# Altium schematic symbol library IC_TI.SCHLIB: 1162 symbols (part 7 of 8) (continued)
## TPS54335ADDAR (continued)

## TPS54335ADRCR
designator U?
Integrated Circuit; Manufacturer_Name: Texas Instruments; Manufacturer_Part_Number: TPS54335ADRCR; Datasheet Link: http://www.ti.com/lit/gpn/tps54335a; Height: 1mm; Mouser Part Number: 595-TPS54335ADRCR; Mouser Price/Stock: https://www.mouser.com/Search/Refine.aspx?Keyword=595-TPS54335ADRCR
footprint DFN10_0.5-PAD(3X3)
pins: 1 VIN, 2 PH, 3 GND_1, 4 GND_2, 5 GND_3, 6 VSENSE, 7 COMP, 8 EN, 9 BOOT, 10 RT, 11 EP

## TPS54340DDA
designator U?
Integrated Circuit; Manufacturer_Name: Texas Instruments; Manufacturer_Part_Number: TPS54340DDA; Datasheet Link: http://uk.rs-online.com/web/p/products/8123476; Height: 1.7mm; Mouser Part Number: 595-TPS54340DDA; Mouser Price/Stock: https://www.mouser.com/Search/Refine.aspx?Keyword=595-TPS54340DDA; RS Part Number: 8123476P; RS Price/Stock: http://uk.rs-online.com/web/p/products/8123476P
footprint SOIC8_1.27-PAD
pins: 1 BOOT, 2 VIN, 3 EN, 4 RT/CLK, 5 FB, 6 COMP, 7 GND, 8 SW, 9 EP

## TPS54360DDA
designator U?
Integrated Circuit; Manufacturer_Name: Texas Instruments; Manufacturer_Part_Number: TPS54360DDA; Datasheet Link: http://www.ti.com/lit/gpn/tps54360; Height: 1.7mm; Mouser Part Number: 595-TPS54360DDA; Mouser Price/Stock: https://www.mouser.com/Search/Refine.aspx?Keyword=595-TPS54360DDA
footprint SOIC8_1.27-PAD
pins: 1 BOOT, 2 VIN, 3 EN, 4 RT/CLK, 5 FB, 6 COMP, 7 GND, 8 SW, 9 EP

## TPS54560BQDDARQ1
designator U?
Integrated Circuit; Manufacturer_Name: Texas Instruments; Manufacturer_Part_Number: TPS54560BQDDARQ1; Datasheet Link: http://www.ti.com/lit/gpn/tps54560b-q1; Height: 1.7mm; Mouser Part Number: 595-TPS54560BQDDARQ1; Mouser Price/Stock: https://www.mouser.com/Search/Refine.aspx?Keyword=595-TPS54560BQDDARQ1
footprint SOIC8_1.27-PAD
pins: 1 BOOT, 2 VIN, 3 EN, 4 RT/CLK, 5 FB, 6 COMP, 7 GND, 8 SW, 9 EP

## TPS54620RGYT
designator U?
Integrated Circuit; Manufacturer_Name: Texas Instruments; Manufacturer_Part_Number: TPS54620RGYT; Datasheet Link: http://www.ti.com/lit/gpn/tps54620; Mouser Part Number: 595-TPS54620RGYT; Mouser Price/Stock: https://www.mouser.com/Search/Refine.aspx?Keyword=595-TPS54620RGYT; RS Part Number: 9222408; RS Price/Stock: http://uk.rs-online.com/web/p/products/9222408
footprint VQFN14_0.5-PAD(3.5X3.5)
pins: 1 RT/CLK, 2 GND_1, 3 GND_2, 4 PVIN_1, 5 PVIN_2, 6 VIN, 7 VSENSE, 8 COMP, 9 SS/TR, 10 EN, 11 PH_1, 12 PH_2, 13 BOOST, 14 PWRGD, 15 EXPOSED_THERMAL_PAD

## TPS54628DDAR
designator U?
Integrated Circuit; Manufacturer_Name: Texas Instruments; Manufacturer_Part_Number: TPS54628DDAR; Datasheet Link: http://www.ti.com/general/docs/lit/getliterature.tsp?genericPartNumber=tps54628&fileType=pdf; Height: 1.7mm; Mouser Part Number: 595-TPS54628DDAR; Mouser Price/Stock: https://www.mouser.com/Search/Refine.aspx?Keyword=595-TPS54628DDAR
footprint SOIC8_1.27-PAD
pins: 1 EN (in), 2 VFB (in), 3 VREG5 (out), 4 SS (in), 5 GND (power), 6 SW (out), 7 VBST (out), 8 VIN (power), 9 PWPD (power)

## TPS55340PWP
designator U?
Integrated Circuit; Manufacturer_Name: Texas Instruments; Manufacturer_Part_Number: TPS55340PWP; Datasheet Link: http://www.ti.com/lit/ds/symlink/tps55340.pdf; Height: 1.2mm; Mouser Part Number: 595-TPS55340PWP; Mouser Price/Stock: https://www.mouser.com/Search/Refine.aspx?Keyword=595-TPS55340PWP; RS Part Number: 8123568P; RS Price/Stock: http://uk.rs-online.com/web/p/products/8123568P
footprint TSSOP14_0.65-PAD (TSOP, 14-Leads, Body 5.00x4.40mm, Pitch 0.65mm, Thermal Pad 2.31x2.46mm, IPC Low Density)
pins: 1 SW_1, 2 SW_2, 3 VIN, 4 EN, 5 SS, 6 SYNC, 7 AGND, 8 COMP, 9 FB, 10 FREQ, 11 NC, 12 PGND_1, 13 PGND_2, 14 PGND_3, 15 EP

## TPS55340RTER
designator U?
Integrated Circuit; Manufacturer_Name: Texas Instruments; Manufacturer_Part_Number: TPS55340RTER; Datasheet Link: http://www.ti.com/general/docs/lit/getliterature.tsp?genericPartNumber=TPS55340&&fileType=pdf; Height: 0.8mm; Mouser Part Number: 595-TPS55340RTER; Mouser Price/Stock: https://www.mouser.com/Search/Refine.aspx?Keyword=595-TPS55340RTER
footprint QFN16_0.5-PAD(3X3) (QFN, 16-Leads, Body 3.0x3.0mm (max), Pitch 0.50mm, IPC Low Density)
pins: 1 SW_1, 2 VIN, 3 EN, 4 SS, 5 SYNC, 6 AGND, 7 COMP, 8 FB, 9 FREQ, 10 NC_1, 11 PGND_1, 12 PGND_2, 13 PGND_3, 14 NC_2, 15 SW_2, 16 SW_3, 17 POWERPAD

## TPS60400DBVT
designator U?
Integrated Circuit; Manufacturer_Name: Texas Instruments; Manufacturer_Part_Number: TPS60400DBVT; Datasheet Link: http://componentsearchengine.com/Datasheets/3/TPS60400DBVT.pdf; Mouser Part Number: 595-TPS60400DBVT; Mouser Price/Stock: https://www.mouser.com/Search/Refine.aspx?Keyword=595-TPS60400DBVT; RS Part Number: 0526975; RS Price/Stock: http://uk.rs-online.com/web/p/products/0526975
footprint SOT23-5 (SOT23, 5-Leads, Body 3.0x3.0mm (max), Pitch 0.95mm, IPC Medium Density)
pins: 1 OUT, 2 IN, 3 CFLY-, 4 GND, 5 CFLY+

## TPS60401DBVT
designator U?
Integrated Circuit; Manufacturer_Name: Texas Instruments; Manufacturer_Part_Number: TPS60401DBVT; Datasheet Link: http://www.ti.com/lit/ds/symlink/tps60401.pdf; Height: 1.45mm; Mouser Part Number: 595-TPS60401DBVT; Mouser Price/Stock: https://www.mouser.com/Search/Refine.aspx?Keyword=595-TPS60401DBVT; RS Part Number: 1456522; RS Price/Stock: http://uk.rs-online.com/web/p/products/1456522
footprint SOT23-5 (SOT23, 5-Leads, Body 3.0x3.0mm (max), Pitch 0.95mm, IPC Medium Density)
pins: 1 OUT (out), 2 IN (in), 3 CFLY-, 4 GND (power), 5 CFLY+

## TPS60403QDBVRQ1
designator U?
Integrated Circuit; Manufacturer_Name: Texas Instruments; Manufacturer_Part_Number: TPS60403QDBVRQ1; Datasheet Link: http://www.ti.com/lit/gpn/tps60403-q1; Height: 1.45mm; Mouser Part Number: 595-TPS60403QDBVRQ1; Mouser Price/Stock: https://www.mouser.com/Search/Refine.aspx?Keyword=595-TPS60403QDBVRQ1
footprint SOT23-5 (SOT23, 5-Leads, Body 3.0x3.0mm (max), Pitch 0.95mm, IPC Medium Density)
pins: 1 OUT, 2 IN, 3 CFLY-, 4 GND, 5 CFLY+

## TPS61021ADSGR
designator PS??
Power Supply; Manufacturer_Name: Texas Instruments; Manufacturer_Part_Number: TPS61021ADSGR; Datasheet Link: http://www.ti.com/lit/ds/symlink/tps61021a.pdf; Height: 0.8mm; Mouser Part Number: 595-TPS61021ADSGR; Mouser Price/Stock: https://www.mouser.com/Search/Refine.aspx?Keyword=595-TPS61021ADSGR
footprint DFN8_0.5-PAD(2X2) (DFN8_0.5-PAD(3X3))
pins: 1 AGND (power), 2 FB (in), 3 VOUT_1 (power), 4 VOUT_2 (power), 5 EN (in), 6 SW_1 (power), 7 SW_2 (power), 8 VIN (in), 9 PGND (power)

## TPS61040DBVR
designator U?
Integrated Circuit; Manufacturer_Name: Texas Instruments; Manufacturer_Part_Number: TPS61040DBVR; Datasheet Link: http://www.ti.com/lit/ds/symlink/tps61040.pdf; Height: 1.45mm; Mouser Part Number: 595-TPS61040DBVR; Mouser Price/Stock: https://www.mouser.com/Search/Refine.aspx?Keyword=595-TPS61040DBVR; RS Part Number: 7320695P; RS Price/Stock: http://uk.rs-online.com/web/p/products/7320695P
footprint SOT23-5 (SOT23, 5-Leads, Body 3.0x3.0mm (max), Pitch 0.95mm, IPC Medium Density)
pins: 1 SW, 2 GND, 3 FB (power), 4 EN, 5 VIN (in)

## TPS61041DBVR
designator U?
Integrated Circuit; Manufacturer_Name: Texas Instruments; Manufacturer_Part_Number: TPS61041DBVR; Datasheet Link: http://www.ti.com/lit/gpn/tps61041; Mouser Part Number: 595-TPS61041DBVR; Mouser Price/Stock: https://www.mouser.com/Search/Refine.aspx?Keyword=595-TPS61041DBVR; RS Part Number: 7094617P; RS Price/Stock: http://uk.rs-online.com/web/p/products/7094617P
footprint SOT23-5 (SOT23, 5-Leads, Body 3.0x3.0mm (max), Pitch 0.95mm, IPC Medium Density)
pins: 1 SW, 2 GND, 3 FB, 4 EN, 5 VIN

## TPS61042DRBRG4
designator U?
Integrated Circuit; Manufacturer_Name: Texas Instruments; Manufacturer_Part_Number: TPS61042DRBRG4; Datasheet Link: http://www.ti.com/lit/ds/symlink/tps61042.pdf; Height: 1mm; Mouser Part Number: 595-TPS61042DRBRG4; Mouser Price/Stock: https://www.mouser.com/Search/Refine.aspx?Keyword=595-TPS61042DRBRG4
footprint HVSON8_0.65-PAD
pins: 1 LED, 2 RS, 3 VIN, 4 FB, 5 CTRL, 6 GND, 7 OVP, 8 SW, 9 EP

## TPS61085DGKT
designator U?
Integrated Circuit; Manufacturer_Name: Texas Instruments; Manufacturer_Part_Number: TPS61085DGKT; Datasheet Link: http://www.ti.com/lit/gpn/tps61085; Height: 1.1mm; Mouser Part Number: 595-TPS61085DGKT; Mouser Price/Stock: https://www.mouser.com/Search/Refine.aspx?Keyword=595-TPS61085DGKT; RS Part Number: 7098877P; RS Price/Stock: http://uk.rs-online.com/web/p/products/7098877P
footprint VSSOP8_0.65-PAD
pins: 1 COMP, 2 FB, 3 EN, 4 PGND, 5 SW, 6 IN, 7 FREQ, 8 SS

## TPS61085PWR
designator U?
Integrated Circuit; Manufacturer_Name: Texas Instruments; Manufacturer_Part_Number: TPS61085PWR; Datasheet Link: http://www.ti.com/lit/ds/symlink/tps61085.pdf; Height: 1.2mm; Mouser Part Number: 595-TPS61085PWR; Mouser Price/Stock: https://www.mouser.com/Search/Refine.aspx?Keyword=595-TPS61085PWR
footprint TSSOP8_0.65
pins: 1 COMP, 2 FB, 3 EN, 4 PGND (power), 5 SW, 6 IN (in), 7 FREQ, 8 SS

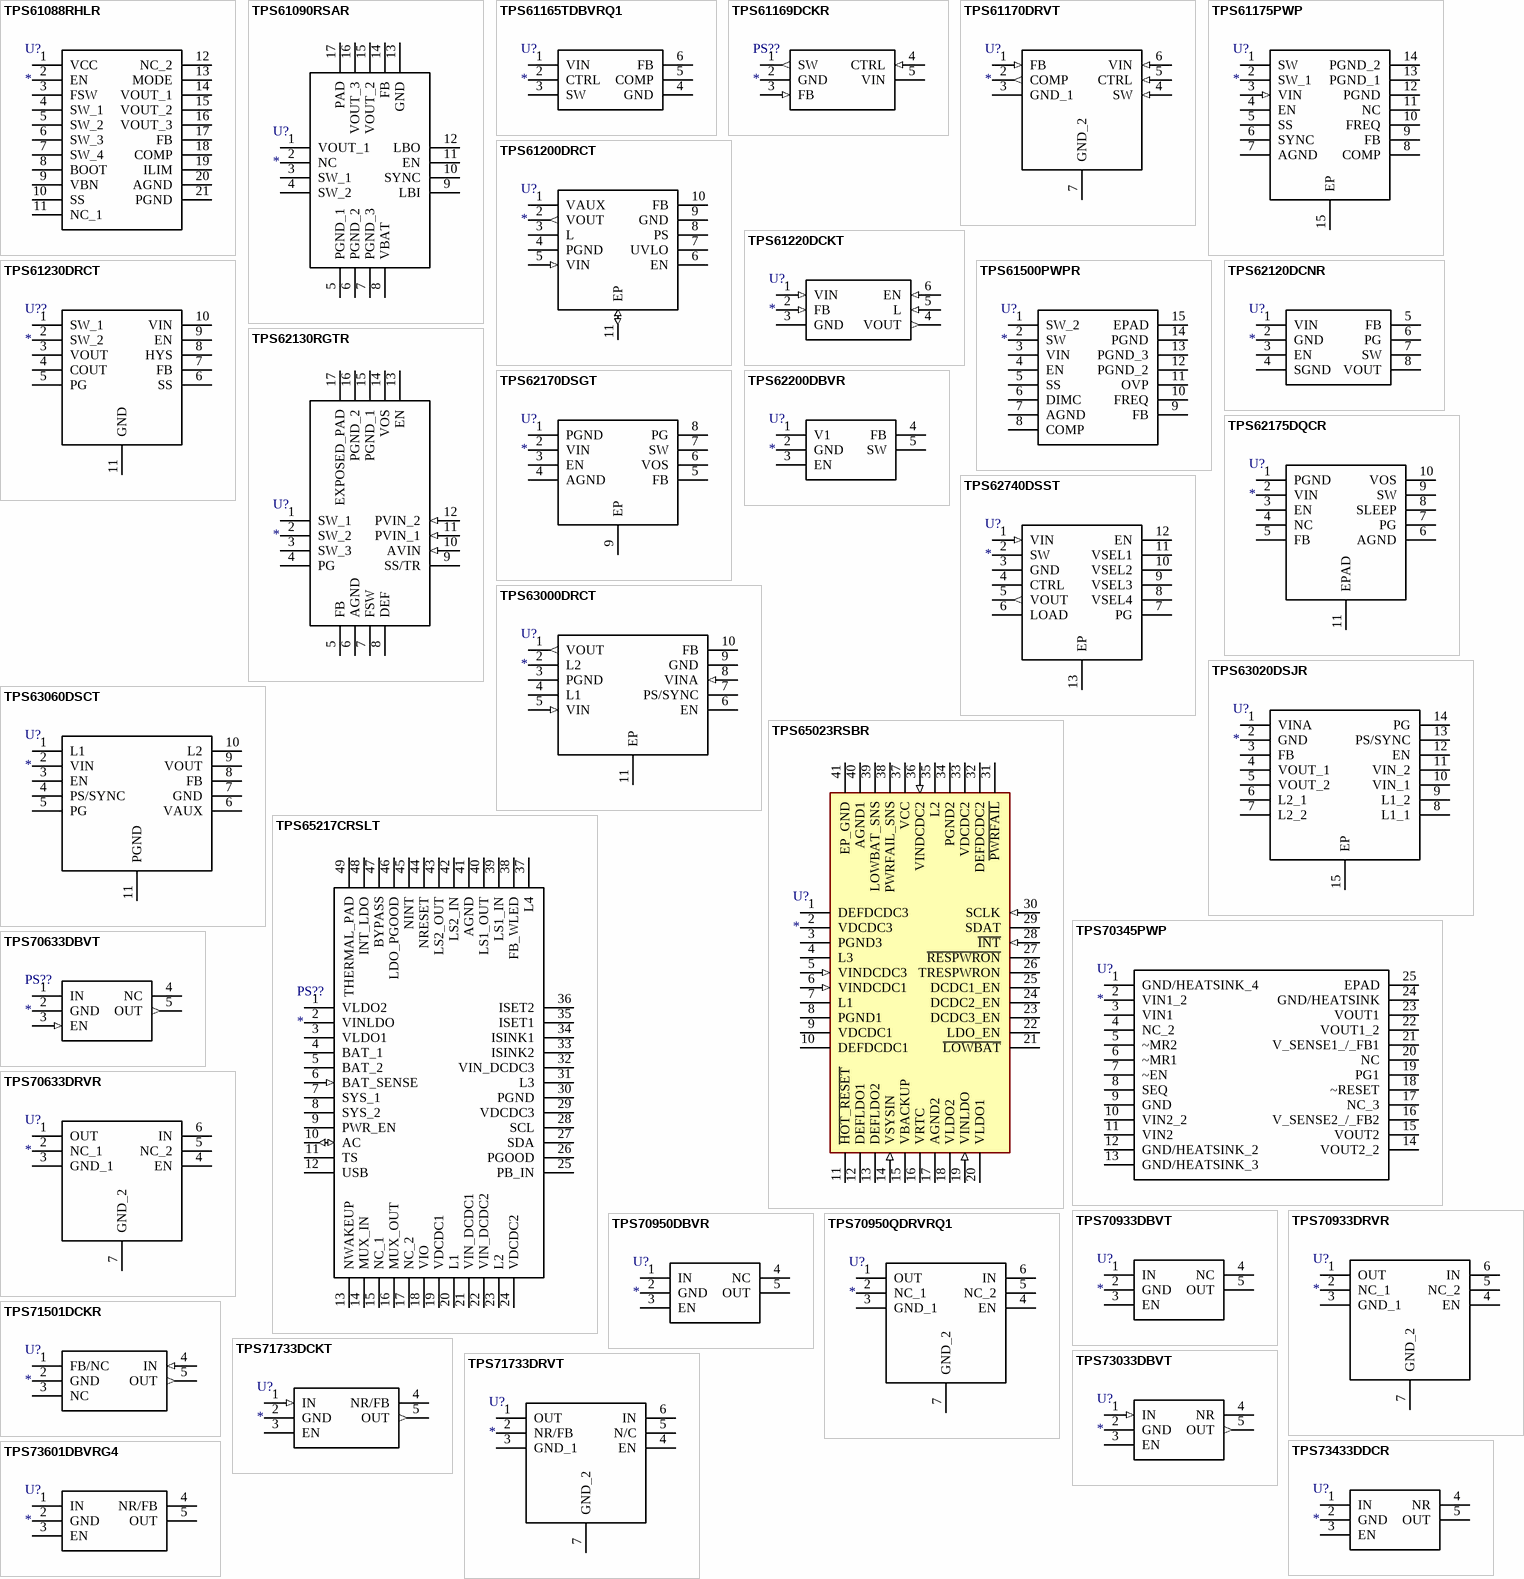
[diagram p32: symbols TPS61088RHLR to TPS73601DBVRG4]

## TPS61088RHLR
designator U?
Integrated Circuit; Manufacturer_Name: Texas Instruments; Manufacturer_Part_Number: TPS61088RHLR; Datasheet Link: http://www.ti.com/lit/gpn/tps61088; Mouser Part Number: 595-TPS61088RHLR; Mouser Price/Stock: https://www.mouser.com/Search/Refine.aspx?Keyword=595-TPS61088RHLR
footprint VQFN20_0.5-PAD(3.5X4.5) (QFN, 20-Leads, Body 4.7x3.7mm (max), Pitch 1.50mm, Pitch1 0.50mm, IPC Low Density)
pins: 1 VCC, 2 EN, 3 FSW, 4 SW_1, 5 SW_2, 6 SW_3, 7 SW_4, 8 BOOT, 9 VBN, 10 SS, 11 NC_1, 12 NC_2, 13 MODE, 14 VOUT_1, 15 VOUT_2, 16 VOUT_3, 17 FB, 18 COMP, 19 ILIM, 20 AGND, 21 PGND

## TPS61090RSAR
designator U?
Integrated Circuit; Manufacturer_Name: Texas Instruments; Manufacturer_Part_Number: TPS61090RSAR; Datasheet Link: http://www.ti.com/general/docs/lit/getliterature.tsp?genericPartNumber=tps61090&fileType=pdf; Height: 1mm; Mouser Part Number: 595-TPS61090RSAR; Mouser Price/Stock: https://www.mouser.com/Search/Refine.aspx?Keyword=595-TPS61090RSAR; RS Part Number: 1626463; RS Price/Stock: http://uk.rs-online.com/web/p/products/1626463
footprint QFN16_0.65-PAD(4x4) (QFN, 16-Leads, Body 3.0x3.0mm (max), Pitch 0.50mm, IPC Low Density)
pins: 1 VOUT_1, 2 NC, 3 SW_1, 4 SW_2, 5 PGND_1, 6 PGND_2, 7 PGND_3, 8 VBAT, 9 LBI, 10 SYNC, 11 EN, 12 LBO, 13 GND, 14 FB, 15 VOUT_2, 16 VOUT_3, 17 PAD

## TPS61165TDBVRQ1
designator U?
Integrated Circuit; Manufacturer_Name: Texas Instruments; Manufacturer_Part_Number: TPS61165TDBVRQ1; Datasheet Link: http://www.ti.com/lit/gpn/tps61165-q1; Height: 1.45mm; Mouser Part Number: 595-TPS61165TDBVRQ1; Mouser Price/Stock: https://www.mouser.com/Search/Refine.aspx?Keyword=595-TPS61165TDBVRQ1
footprint SOT23-6
pins: 1 VIN, 2 CTRL, 3 SW, 4 GND, 5 COMP, 6 FB

## TPS61169DCKR
designator PS??
Power Supply; Manufacturer_Name: Texas Instruments; Manufacturer_Part_Number: TPS61169DCKR; Datasheet Link: http://www.ti.com/lit/gpn/tps61169; Height: 1.1mm; Mouser Part Number: 595-TPS61169DCKR; Mouser Price/Stock: https://www.mouser.com/Search/Refine.aspx?Keyword=595-TPS61169DCKR
footprint SOT353
pins: 1 SW (out), 2 GND (power), 3 FB (in), 4 CTRL (in), 5 VIN (power)

## TPS61170DRVT
designator U?
Integrated Circuit; Manufacturer_Name: Texas Instruments; Manufacturer_Part_Number: TPS61170DRVT; Datasheet Link: http://www.ti.com/lit/ds/slvs789d/slvs789d.pdf; Height: 0.8mm; Mouser Part Number: 595-TPS61170DRVT; Mouser Price/Stock: https://www.mouser.com/Search/Refine.aspx?Keyword=595-TPS61170DRVT; RS Part Number: 6616948P; RS Price/Stock: http://uk.rs-online.com/web/p/products/6616948P
footprint DFN6_0.65-PAD(2.2X2.5)
pins: 1 FB (in), 2 COMP (out), 3 GND_1 (power), 4 SW (in), 5 CTRL (in), 6 VIN (in), 7 GND_2 (power)

## TPS61175PWP
designator U?
Integrated Circuit; Manufacturer_Name: Texas Instruments; Manufacturer_Part_Number: TPS61175PWP; Datasheet Link: http://docs-emea.rs-online.com/webdocs/0e32/0900766b80e32258.pdf; Height: 1.2mm; Mouser Part Number: 595-TPS61175PWP; Mouser Price/Stock: https://www.mouser.com/Search/Refine.aspx?Keyword=595-TPS61175PWP; RS Part Number: 7092435P; RS Price/Stock: http://uk.rs-online.com/web/p/products/7092435P
footprint TSSOP14_0.65-PAD (TSOP, 14-Leads, Body 5.00x4.40mm, Pitch 0.65mm, Thermal Pad 2.31x2.46mm, IPC Low Density)
pins: 1 SW, 2 SW_1, 3 VIN (in), 4 EN, 5 SS, 6 SYNC, 7 AGND (power), 8 COMP, 9 FB, 10 FREQ, 11 NC, 12 PGND (power), 13 PGND_1 (power), 14 PGND_2 (power), 15 EP

## TPS61200DRCT
designator U?
Integrated Circuit; Manufacturer_Name: Texas Instruments; Manufacturer_Part_Number: TPS61200DRCT; Datasheet Link: http://www.ti.com/lit/ds/symlink/tps61200.pdf; Height: 1mm; Mouser Part Number: 595-TPS61200DRCT; Mouser Price/Stock: https://www.mouser.com/Search/Refine.aspx?Keyword=595-TPS61200DRCT; RS Part Number: 0389322; RS Price/Stock: http://uk.rs-online.com/web/p/products/0389322
footprint DFN10_0.5-PAD(3X3)
pins: 1 VAUX, 2 VOUT (out), 3 L, 4 PGND (power), 5 VIN (in), 6 EN, 7 UVLO, 8 PS, 9 GND (power), 10 FB, 11 EP (io)

## TPS61220DCKT
designator U?
Integrated Circuit; Manufacturer_Name: Texas Instruments; Manufacturer_Part_Number: TPS61220DCKT; Datasheet Link: http://www.ti.com/lit/ds/symlink/tps61220.pdf; Height: 1.1mm; Mouser Part Number: 595-TPS61220DCKT; Mouser Price/Stock: https://www.mouser.com/Search/Refine.aspx?Keyword=595-TPS61220DCKT; RS Part Number: 7094642P; RS Price/Stock: http://uk.rs-online.com/web/p/products/7094642P
footprint SOT363
pins: 1 VIN (in), 2 FB (in), 3 GND (power), 4 VOUT (out), 5 L (in), 6 EN (in)

## TPS61230DRCT
designator U??
Undefined or Miscellaneous; Manufacturer_Name: Texas Instruments; Manufacturer_Part_Number: TPS61230DRCT; Datasheet Link: http://www.ti.com/lit/ds/symlink/tps61230.pdf; Height: 1mm; Mouser Part Number: 595-TPS61230DRCT; Mouser Price/Stock: https://www.mouser.com/Search/Refine.aspx?Keyword=595-TPS61230DRCT
footprint DFN10_0.5-PAD(3X3)
pins: 1 SW_1, 2 SW_2, 3 VOUT, 4 COUT, 5 PG, 6 SS, 7 FB, 8 HYS, 9 EN, 10 VIN, 11 GND

## TPS61500PWPR
designator U?
Integrated Circuit; Manufacturer_Name: Texas Instruments; Manufacturer_Part_Number: TPS61500PWPR; Datasheet Link: http://www.ti.com/lit/gpn/tps61500; Mouser Part Number: 595-TPS61500PWPR; Mouser Price/Stock: https://www.mouser.com/Search/Refine.aspx?Keyword=595-TPS61500PWPR
footprint TSSOP14_0.65-PAD (TSOP, 14-Leads, Body 5.00x4.40mm, Pitch 0.65mm, Thermal Pad 2.31x2.46mm, IPC Low Density)
pins: 1 SW_2, 2 SW, 3 VIN, 4 EN, 5 SS, 6 DIMC, 7 AGND, 8 COMP, 9 FB, 10 FREQ, 11 OVP, 12 PGND_2, 13 PGND_3, 14 PGND, 15 EPAD

## TPS62120DCNR
designator U?
Integrated Circuit; Manufacturer_Name: Texas Instruments; Manufacturer_Part_Number: TPS62120DCNR; Datasheet Link: http://www.ti.com/lit/gpn/tps62120; Mouser Part Number: 595-TPS62120DCNR; Mouser Price/Stock: https://www.mouser.com/Search/Refine.aspx?Keyword=595-TPS62120DCNR
footprint SOT23-8 (TSOP, 8-Leads, Body 2.9x1.6mm (max), Pitch 0.65mm, IPC Medium Density)
pins: 1 VIN, 2 GND, 3 EN, 4 SGND, 5 FB, 6 PG, 7 SW, 8 VOUT

## TPS62130RGTR
designator U?
Integrated Circuit; Manufacturer_Name: Texas Instruments; Manufacturer_Part_Number: TPS62130RGTR; Datasheet Link: http://www.ti.com/lit/ds/symlink/tps62130.pdf; Height: 0.8mm; Mouser Part Number: 595-TPS62130RGTR; Mouser Price/Stock: https://www.mouser.com/Search/Refine.aspx?Keyword=595-TPS62130RGTR
footprint QFN16_0.5-PAD(3X3) (QFN, 16-Leads, Body 3.0x3.0mm (max), Pitch 0.50mm, IPC Low Density)
pins: 1 SW_1, 2 SW_2, 3 SW_3, 4 PG, 5 FB, 6 AGND (power), 7 FSW, 8 DEF, 9 SS/TR, 10 AVIN (in), 11 PVIN_1 (in), 12 PVIN_2 (in), 13 EN, 14 VOS, 15 PGND_1 (power), 16 PGND_2 (power), 17 EXPOSED_PAD

## TPS62170DSGT
designator U?
Integrated Circuit; Manufacturer_Name: Texas Instruments; Manufacturer_Part_Number: TPS62170DSGT; Datasheet Link: http://www.ti.com/lit/gpn/tps62170; Height: 0.8mm; Mouser Part Number: 595-TPS62170DSGT; Mouser Price/Stock: https://www.mouser.com/Search/Refine.aspx?Keyword=595-TPS62170DSGT; RS Part Number: 1626775; RS Price/Stock: http://uk.rs-online.com/web/p/products/1626775
footprint DFN8_0.5-PAD(2X2) (DFN8_0.5-PAD(3X3))
pins: 1 PGND, 2 VIN, 3 EN, 4 AGND, 5 FB, 6 VOS, 7 SW, 8 PG, 9 EP

## TPS62175DQCR
designator U?
Integrated Circuit; Manufacturer_Name: Texas Instruments; Manufacturer_Part_Number: TPS62175DQCR; Datasheet Link: http://www.ti.com/lit/gpn/tps62175; Height: 0.8mm; Mouser Part Number: 595-TPS62175DQCR; Mouser Price/Stock: https://www.mouser.com/Search/Refine.aspx?Keyword=595-TPS62175DQCR; RS Part Number: 1684374; RS Price/Stock: http://uk.rs-online.com/web/p/products/1684374
footprint DFN10_0.5-PAD(2X3)
pins: 1 PGND, 2 VIN, 3 EN, 4 NC, 5 FB, 6 AGND, 7 PG, 8 SLEEP, 9 SW, 10 VOS, 11 EPAD

## TPS62200DBVR
designator U?
Integrated Circuit; Manufacturer_Name: Texas Instruments; Manufacturer_Part_Number: TPS62200DBVR; Datasheet Link: http://www.ti.com/lit/gpn/tps62200; Mouser Part Number: 595-TPS62200DBVR; Mouser Price/Stock: https://www.mouser.com/Search/Refine.aspx?Keyword=595-TPS62200DBVR
footprint SOT23-5 (SOT23, 5-Leads, Body 3.0x3.0mm (max), Pitch 0.95mm, IPC Medium Density)
pins: 1 V1, 2 GND, 3 EN, 4 FB, 5 SW

## TPS62740DSST
designator U?
Integrated Circuit; Manufacturer_Name: Texas Instruments; Manufacturer_Part_Number: TPS62740DSST; Datasheet Link: http://docs-emea.rs-online.com/webdocs/1323/0900766b81323414.pdf; Height: 0.8mm; Mouser Part Number: 595-TPS62740DSST; Mouser Price/Stock: https://www.mouser.com/Search/Refine.aspx?Keyword=595-TPS62740DSST; RS Part Number: 8257018P; RS Price/Stock: http://uk.rs-online.com/web/p/products/8257018P
footprint DFN12_0.5-PAD(3X2)
pins: 1 VIN (in), 2 SW, 3 GND (power), 4 CTRL, 5 VOUT (out), 6 LOAD, 7 PG, 8 VSEL4, 9 VSEL3, 10 VSEL2, 11 VSEL1, 12 EN, 13 EP

## TPS63000DRCT
designator U?
Integrated Circuit; Manufacturer_Name: Texas Instruments; Manufacturer_Part_Number: TPS63000DRCT; Datasheet Link: http://www.ti.com/lit/ds/symlink/tps63000.pdf; Height: 1mm; Mouser Part Number: 595-TPS63000DRCT; Mouser Price/Stock: https://www.mouser.com/Search/Refine.aspx?Keyword=595-TPS63000DRCT; RS Part Number: 0389334P; RS Price/Stock: http://uk.rs-online.com/web/p/products/0389334P
footprint DFN10_0.5-PAD(3X3)
pins: 1 VOUT (out), 2 L2, 3 PGND (power), 4 L1, 5 VIN (in), 6 EN, 7 PS/SYNC, 8 VINA (in), 9 GND (power), 10 FB, 11 EP

## TPS63020DSJR
designator U?
Integrated Circuit; Manufacturer_Name: Texas Instruments; Manufacturer_Part_Number: TPS63020DSJR; Datasheet Link: http://www.ti.com/lit/ds/symlink/tps63020.pdf; Height: 1mm; Mouser Part Number: 595-TPS63020DSJR; Mouser Price/Stock: https://www.mouser.com/Search/Refine.aspx?Keyword=595-TPS63020DSJR
footprint DFN14_0.5-PAD(3X4)
pins: 1 VINA, 2 GND, 3 FB, 4 VOUT_1, 5 VOUT_2, 6 L2_1, 7 L2_2, 8 L1_1, 9 L1_2, 10 VIN_1, 11 VIN_2, 12 EN, 13 PS/SYNC, 14 PG, 15 EP

## TPS63060DSCT
designator U?
Integrated Circuit; Manufacturer_Name: Texas Instruments; Manufacturer_Part_Number: TPS63060DSCT; Datasheet Link: http://www.ti.com/lit/ds/symlink/tps63060.pdf; Height: 0.8mm; Mouser Part Number: 595-TPS63060DSCT; Mouser Price/Stock: https://www.mouser.com/Search/Refine.aspx?Keyword=595-TPS63060DSCT; RS Part Number: 8123801P; RS Price/Stock: http://uk.rs-online.com/web/p/products/8123801P
footprint DFN10_0.5-PAD(3X3)
pins: 1 L1, 2 VIN, 3 EN, 4 PS/SYNC, 5 PG, 6 VAUX, 7 GND, 8 FB, 9 VOUT, 10 L2, 11 PGND

## TPS65023RSBR
designator U?
Integrated Circuit; Manufacturer_Name: Texas Instruments; Manufacturer_Part_Number: TPS65023RSBR; Datasheet Link: http://www.ti.com/lit/ds/symlink/tps65023.pdf; Height: 0.8mm; Mouser Part Number: 595-TPS65023RSBR; Mouser Price/Stock: https://www.mouser.com/Search/Refine.aspx?Keyword=595-TPS65023RSBR
footprint QFN40_0.4-PAD(5X5)
pins: 1 DEFDCDC3, 2 VDCDC3, 3 PGND3 (power), 4 L3, 5 VINDCDC3 (in), 6 VINDCDC1 (in), 7 L1, 8 PGND1 (power), 9 VDCDC1, 10 DEFDCDC1, 11 ~{HOT_RESET}, 12 DEFLDO1, 13 DEFLDO2, 14 VSYSIN (in), 15 VBACKUP, 16 VRTC, 17 AGND2 (power), 18 VLDO2, 19 VINLDO (in), 20 VLDO1, 21 ~{LOWBAT}, 22 LDO_EN, 23 DCDC3_EN, 24 DCDC2_EN, 25 DCDC1_EN, 26 TRESPWRON, 27 ~{RESPWRON}, 28 ~{INT} (in), 29 SDAT, 30 SCLK (in), 31 ~{PWRFAIL}, 32 DEFDCDC2, 33 VDCDC2, 34 PGND2 (power), 35 L2, 36 VINDCDC2 (in), 37 VCC (power), 38 PWRFAIL_SNS, 39 LOWBAT_SNS, 40 AGND1 (power), 41 EP_GND (power)

## TPS65217CRSLT
designator PS??
Power Supply; Manufacturer_Name: Texas Instruments; Manufacturer_Part_Number: TPS65217CRSLT; Datasheet Link: http://www.ti.com/lit/gpn/tps65217; Height: 1mm; Mouser Part Number: 595-TPS65217CRSLT; Mouser Price/Stock: https://www.mouser.com/Search/Refine.aspx?Keyword=595-TPS65217CRSLT; RS Part Number: 9222335; RS Price/Stock: http://uk.rs-online.com/web/p/products/9222335
footprint QFN48_0.4-PAD(6X6) (QFN, 48-Leads, Body 7.2x7.2mm (max), Pitch 0.50mm, IPC Medium Density)
pins: 1 VLDO2, 2 VINLDO, 3 VLDO1, 4 BAT_1 (power), 5 BAT_2 (power), 6 BAT_SENSE (in), 7 SYS_1, 8 SYS_2, 9 PWR_EN, 10 AC (io), 11 TS, 12 USB, 13 NWAKEUP, 14 MUX_IN, 15 NC_1, 16 MUX_OUT, 17 NC_2, 18 VIO, 19 VDCDC1, 20 L1, 21 VIN_DCDC1, 22 VIN_DCDC2, 23 L2, 24 VDCDC2, 25 PB_IN, 26 PGOOD, 27 SDA, 28 SCL, 29 VDCDC3, 30 PGND, 31 L3, 32 VIN_DCDC3, 33 ISINK2, 34 ISINK1, 35 ISET1, 36 ISET2, 37 L4, 38 FB_WLED, 39 LS1_IN, 40 LS1_OUT, 41 AGND, 42 LS2_IN, 43 LS2_OUT, 44 NRESET, 45 NINT, 46 LDO_PGOOD, 47 BYPASS, 48 INT_LDO, 49 THERMAL_PAD

## TPS70345PWP
designator U?
Integrated Circuit; Manufacturer_Name: Texas Instruments; Manufacturer_Part_Number: TPS70345PWP; Datasheet Link: http://www.ti.com/lit/gpn/tps703; Mouser Part Number: 595-TPS70345PWP; Mouser Price/Stock: https://www.mouser.com/Search/Refine.aspx?Keyword=595-TPS70345PWP
footprint TSSOP24_0.65-PAD (TSOP, 24-Leads, Body 7.80x4.40mm, Pitch 0.65mm, Thermal Pad 5.16x2.40mm, IPC Low Density)
pins: 1 GND/HEATSINK_4, 2 VIN1_2, 3 VIN1, 4 NC_2, 5 ~MR2, 6 ~MR1, 7 ~EN, 8 SEQ, 9 GND, 10 VIN2_2, 11 VIN2, 12 GND/HEATSINK_2, 13 GND/HEATSINK_3, 14 VOUT2_2, 15 VOUT2, 16 V_SENSE2_/_FB2, 17 NC_3, 18 ~RESET, 19 PG1, 20 NC, 21 V_SENSE1_/_FB1, 22 VOUT1_2, 23 VOUT1, 24 GND/HEATSINK, 25 EPAD

## TPS70633DBVT
designator PS??
Power Supply; Manufacturer_Name: Texas Instruments; Manufacturer_Part_Number: TPS70633DBVT; Datasheet Link: http://www.ti.com/lit/ds/symlink/tps706.pdf; Height: 1.45mm; Mouser Part Number: 595-TPS70633DBVT; Mouser Price/Stock: https://www.mouser.com/Search/Refine.aspx?Keyword=595-TPS70633DBVT
footprint SOT23-5 (SOT23, 5-Leads, Body 3.0x3.0mm (max), Pitch 0.95mm, IPC Medium Density)
pins: 1 IN (power), 2 GND (power), 3 EN (in), 4 NC, 5 OUT (out)

## TPS70633DRVR
designator U?
Integrated Circuit; Manufacturer_Name: Texas Instruments; Manufacturer_Part_Number: TPS70633DRVR; Datasheet Link: http://www.ti.com/lit/gpn/tps706; Height: 0.8mm; Mouser Part Number: 595-TPS70633DRVR; Mouser Price/Stock: https://www.mouser.com/Search/Refine.aspx?Keyword=595-TPS70633DRVR
footprint DFN6_0.65-PAD(2.2X2.5)
pins: 1 OUT, 2 NC_1, 3 GND_1, 4 EN, 5 NC_2, 6 IN, 7 GND_2

## TPS70933DBVT
designator U?
Integrated Circuit; Manufacturer_Name: Texas Instruments; Manufacturer_Part_Number: TPS70933DBVT; Datasheet Link: http://www.ti.com/lit/gpn/tps709; Height: 1.45mm; Mouser Part Number: 595-TPS70933DBVT; Mouser Price/Stock: https://www.mouser.com/Search/Refine.aspx?Keyword=595-TPS70933DBVT; RS Part Number: 8257033P; RS Price/Stock: http://uk.rs-online.com/web/p/products/8257033P
footprint SOT23-5 (SOT23, 5-Leads, Body 3.0x3.0mm (max), Pitch 0.95mm, IPC Medium Density)
pins: 1 IN, 2 GND, 3 EN, 4 NC, 5 OUT

## TPS70933DRVR
designator U?
Integrated Circuit; Manufacturer_Name: Texas Instruments; Manufacturer_Part_Number: TPS70933DRVR; Datasheet Link: http://www.ti.com/lit/gpn/tps709; Height: 0.8mm; Mouser Part Number: 595-TPS70933DRVR; Mouser Price/Stock: https://www.mouser.com/Search/Refine.aspx?Keyword=595-TPS70933DRVR
footprint DFN6_0.65-PAD(2.2X2.5)
pins: 1 OUT, 2 NC_1, 3 GND_1, 4 EN, 5 NC_2, 6 IN, 7 GND_2

## TPS70950DBVR
designator U?
Integrated Circuit; Manufacturer_Name: Texas Instruments; Manufacturer_Part_Number: TPS70950DBVR; Datasheet Link: http://www.ti.com/lit/gpn/tps709; Height: 1.45mm; Mouser Part Number: 595-TPS70950DBVR; Mouser Price/Stock: https://www.mouser.com/Search/Refine.aspx?Keyword=595-TPS70950DBVR
footprint SOT23-5 (SOT23, 5-Leads, Body 3.0x3.0mm (max), Pitch 0.95mm, IPC Medium Density)
pins: 1 IN, 2 GND, 3 EN, 4 NC, 5 OUT

## TPS70950QDRVRQ1
designator U?
Integrated Circuit; Manufacturer_Name: Texas Instruments; Manufacturer_Part_Number: TPS70950QDRVRQ1; Datasheet Link: http://www.ti.com/lit/gpn/tps709-q1; Height: 0.8mm; Mouser Part Number: 595-TPS70950QDRVRQ1; Mouser Price/Stock: https://www.mouser.com/Search/Refine.aspx?Keyword=595-TPS70950QDRVRQ1
footprint DFN6_0.65-PAD(2.2X2.5)
pins: 1 OUT, 2 NC_1, 3 GND_1, 4 EN, 5 NC_2, 6 IN, 7 GND_2

## TPS71501DCKR
designator U?
Integrated Circuit; Manufacturer_Name: Texas Instruments; Manufacturer_Part_Number: TPS71501DCKR; Datasheet Link: http://www.ti.com/lit/ds/symlink/tps71533.pdf; Height: 1.1mm; Mouser Part Number: 595-TPS71501DCKR; Mouser Price/Stock: https://www.mouser.com/Search/Refine.aspx?Keyword=595-TPS71501DCKR; RS Part Number: 6613784; RS Price/Stock: http://uk.rs-online.com/web/p/products/6613784
footprint SOT353
pins: 1 FB/NC, 2 GND (power), 3 NC, 4 IN (in), 5 OUT (out)

## TPS71733DCKT
designator U?
Integrated Circuit; Manufacturer_Name: Texas Instruments; Manufacturer_Part_Number: TPS71733DCKT; Datasheet Link: http://www.ti.com/lit/ds/symlink/tps717.pdf; Height: 1.1mm; Mouser Part Number: 595-TPS71733DCKT; Mouser Price/Stock: https://www.mouser.com/Search/Refine.aspx?Keyword=595-TPS71733DCKT; RS Part Number: 0389158P; RS Price/Stock: http://uk.rs-online.com/web/p/products/0389158P
footprint SOT353
pins: 1 IN (in), 2 GND (power), 3 EN, 4 NR/FB, 5 OUT (out)

## TPS71733DRVT
designator U?
Integrated Circuit; Manufacturer_Name: Texas Instruments; Manufacturer_Part_Number: TPS71733DRVT; Datasheet Link: http://www.ti.com/lit/gpn/tps717; Height: 0.8mm; Mouser Part Number: 595-TPS71733DRVT; Mouser Price/Stock: https://www.mouser.com/Search/Refine.aspx?Keyword=595-TPS71733DRVT
footprint DFN6_0.65-PAD(2.2X2.5)
pins: 1 OUT, 2 NR/FB, 3 GND_1, 4 EN, 5 N/C, 6 IN, 7 GND_2

## TPS73033DBVT
designator U?
Integrated Circuit; Manufacturer_Name: Texas Instruments; Manufacturer_Part_Number: TPS73033DBVT; Datasheet Link: http://www.ti.com/lit/ds/symlink/tps73033.pdf; Height: 1.45mm; Mouser Part Number: 595-TPS73033DBVT; Mouser Price/Stock: https://www.mouser.com/Search/Refine.aspx?Keyword=595-TPS73033DBVT; RS Part Number: 6613942P; RS Price/Stock: http://uk.rs-online.com/web/p/products/6613942P
footprint SOT23-5 (SOT23, 5-Leads, Body 3.0x3.0mm (max), Pitch 0.95mm, IPC Medium Density)
pins: 1 IN (in), 2 GND (power), 3 EN, 4 NR, 5 OUT (out)